# Altium schematic symbol library IC_ADI.SCHLIB: 3169 symbols (part 16 of 181)
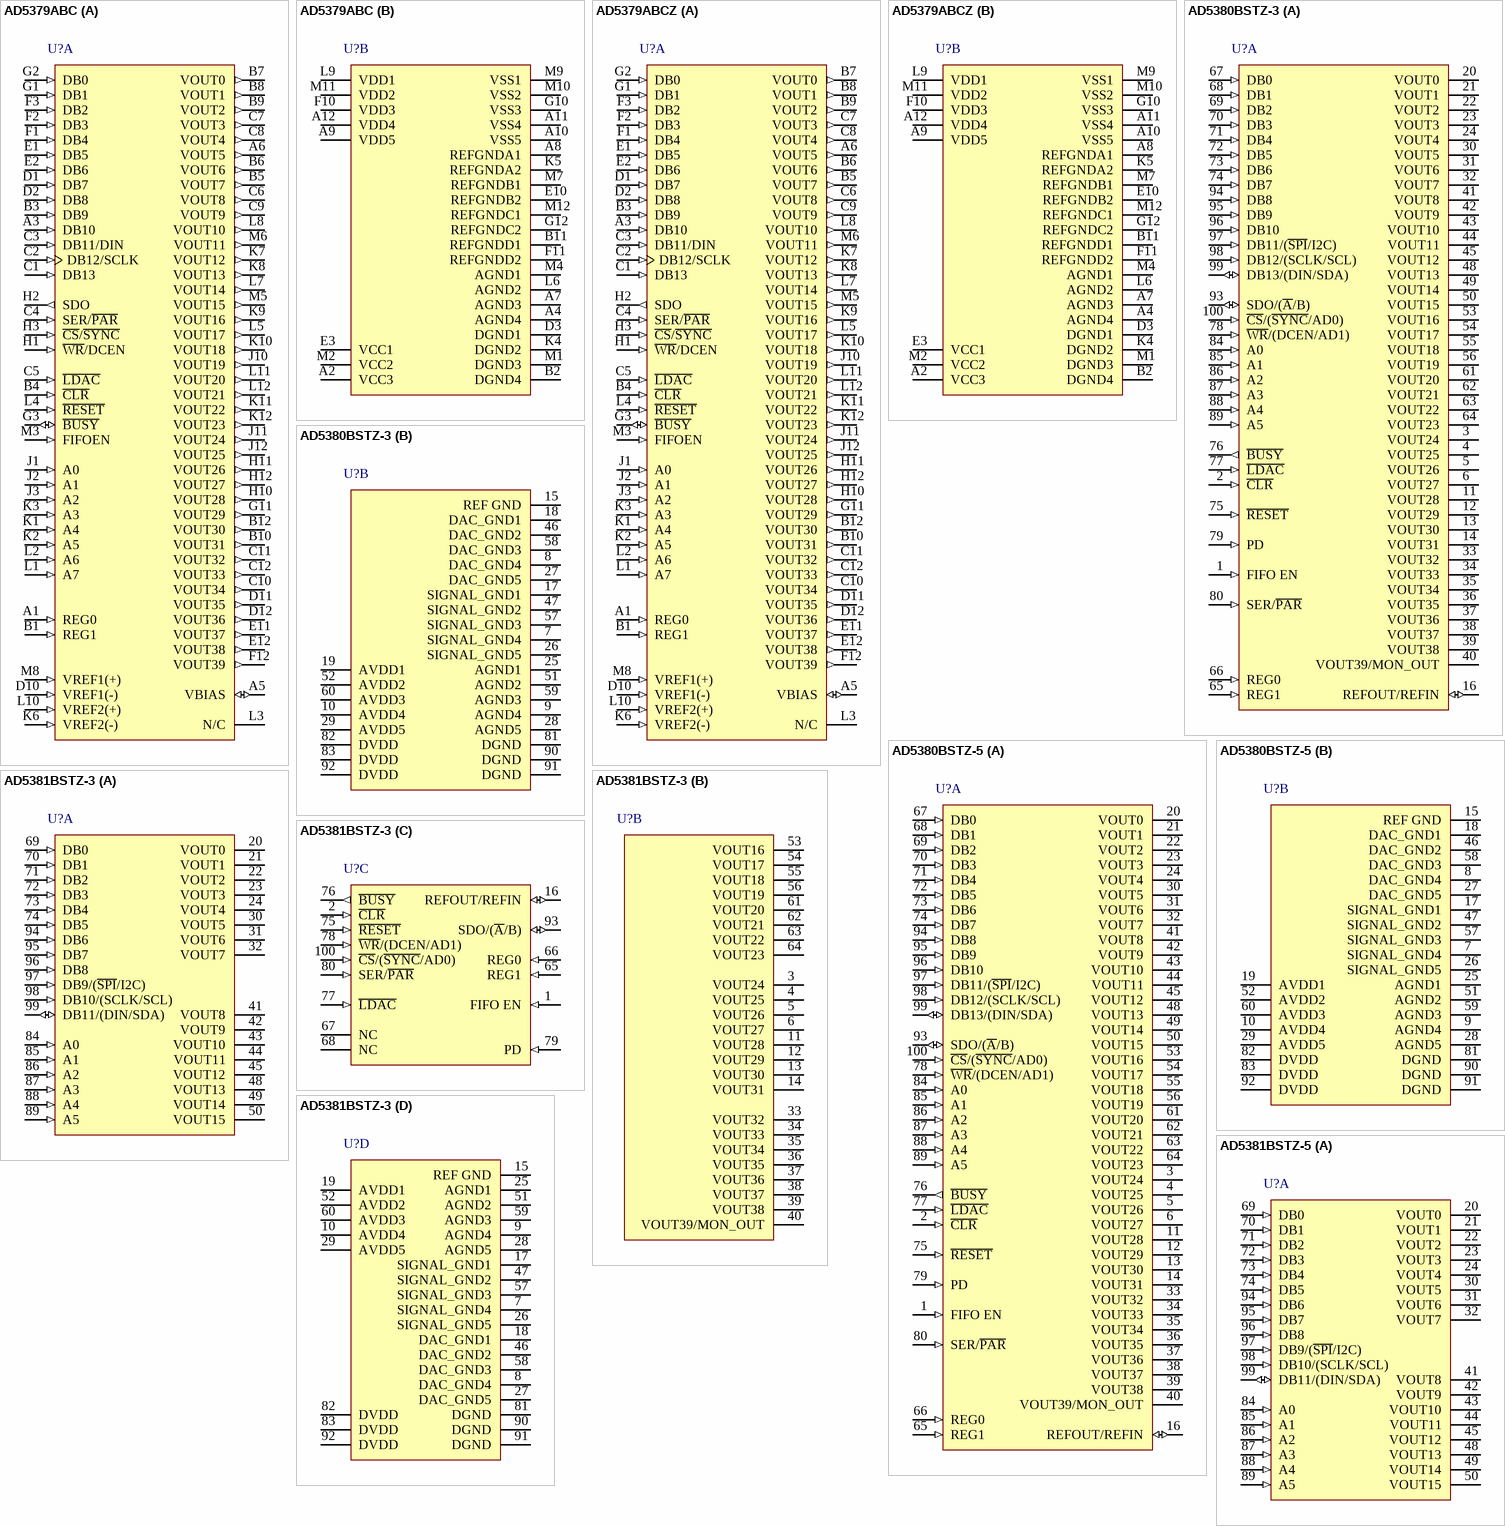
[diagram p206: symbols AD5379ABC to AD5381BSTZ-5]

## AD5379ABCZ
designator U?
40 Channel 14-Bit Bipolar Voltage Output Digital-to-Analog Converter with Parallel and Serial Interface, -40 to +85 degC, BC-108-2, Pb-Free, Tray; Generic Part Number: AD5379; PartNumber: AD5379ABCZ; # DAC Outputs: 40; Max V+: 12.6V; Resolution (Bits): 14; Settling Time: 20祍; Single Supply: No; DatasheetVersion: Rev.B; PackageVersion: 012006-0; PackageReference: BC-108-2; PackageDescription: 108-Ball Chip Scale Package Ball Grid Array [CSP_BGA]; Supplier Part Number 1: AD5379ABCZ-ND; Supplier Part Number 2: 584-AD5379ABCZ; Packing: Tray; RoHS: Y; Mounting Technology: Surface Mount; Code_JEDEC: MO-192-AAD-1; ComponentLink1Description: Manufacturer URL; ComponentLink2Description: Datasheet; ComponentLink3Description: Package Specification; ComponentLink4Description: Product URL
footprint BGA108_1.0(13X13) (Footprint not found)
part A pins: A1 REG0 (in) "Parallel Interface Register Select Input. This pin is used together with REG1 to select data registers, gain registers, offset registers, increment/decrement mode, or the soft reset function. See Table 11.", A3 DB10 (in) "Parallel Data Input. The AD5379 can accept a straight 14-bit parallel word on DB0 to DB13, where DB13 is the MSB and DB0 is the LSB.", A5 VBIAS (io) "DAC Bias Voltage Input/Output. This pin provides an access to the on-chip voltage generator voltage and is provided for bypassing and overdriving purposes only. If VREF(+) > 4.25 V, VBIAS must be pulled high externally to an (See Datasheet)", A6 VOUT5 (out) "DAC Output. Buffered analog outputs for each of the 40 DAC channels. Each analog output is capable of driving an output load of 5 kohm to ground. Typical output impedance of these amplifiers is 1 ohm.", B1 REG1 (in) "Parallel Interface Register Select Input.", B3 DB9 (in) "Parallel Data Input. The AD5379 can accept a straight 14-bit parallel word on DB0 to DB13, where DB13 is the MSB and DB0 is the LSB.", B4 ~{CLR} (in) "Asynchronous Clear Input (Level Sensitive, Active Low). When C\L\R\ is low, the input to each of the DAC output buffer stages, VOUT0 to VOUT39, is switched to the externally set potential on the relevant REFGND pin. While (See Datasheet)", B5 VOUT7 (out) "DAC Output. Buffered analog outputs for each of the 40 DAC channels. Each analog output is capable of driving an output load of 5 kohm to ground. Typical output impedance of these amplifiers is 1 ohm.", B6 VOUT6 (out) "DAC Output. Buffered analog outputs for each of the 40 DAC channels. Each analog output is capable of driving an output load of 5 kohm to ground. Typical output impedance of these amplifiers is 1 ohm.", B7 VOUT0 (out) "DAC Output. Buffered analog outputs for each of the 40 DAC channels. Each analog output is capable of driving an output load of 5 kohm to ground. Typical output impedance of these amplifiers is 1 ohm.", B8 VOUT1 (out) "DAC Output. Buffered analog outputs for each of the 40 DAC channels. Each analog output is capable of driving an output load of 5 kohm to ground. Typical output impedance of these amplifiers is 1 ohm.", B9 VOUT2 (out) "DAC Output. Buffered analog outputs for each of the 40 DAC channels. Each analog output is capable of driving an output load of 5 kohm to ground. Typical output impedance of these amplifiers is 1 ohm.", B10 VOUT31 (out) "DAC Output. Buffered analog outputs for each of the 40 DAC channels. Each analog output is capable of driving an output load of 5 kohm to ground. Typical output impedance of these amplifiers is 1 ohm.", B12 VOUT30 (out) "DAC Output. Buffered analog outputs for each of the 40 DAC channels. Each analog output is capable of driving an output load of 5 kohm to ground. Typical output impedance of these amplifiers is 1 ohm.", C1 DB13 (in) "Parallel Data Input. The AD5379 can accept a straight 14-bit parallel word on DB0 to DB13, where DB13 is the MSB and DB0 is the LSB.", C2 DB12/SCLK (in) "Parallel Data Input. The AD5379 can accept a straight 14-bit parallel word on DB0 to DB13, where DB13 is the MSB and DB0 is the LSB. Serial Clock Input. Data is clocked into the shift register on the falling edge of SCLK. (See Datasheet)", C3 DB11/DIN (in) "Parallel Data Input. The AD5379 can accept a straight 14-bit parallel word on DB0 to DB13, where DB13 is the MSB and DB0 is the LSB. Serial Data Input. Data must be valid on the falling edge of SCLK.", C4 SER/~{PAR} (in) "Interface Select Input. This pin allows the user to select whether the serial or parallel interface is used. This pin has an internal 1 Mohm pull-down resistor, meaning that the default state at power-on is parallel mode. If (See Datasheet)", C5 ~{LDAC} (in) "Load DAC Logic Input (Active Low). If \L\D\A\C\ is taken low while B\U\S\Y\ is inactive (high), the contents of the input registers are transferred to the DAC registers and the DAC outputs are updated. If L\D\A\C\ is taken (See Datasheet)", C6 VOUT8 (out) "DAC Output. Buffered analog outputs for each of the 40 DAC channels. Each analog output is capable of driving an output load of 5 kohm to ground. Typical output impedance of these amplifiers is 1 ohm.", C7 VOUT3 (out) "DAC Output. Buffered analog outputs for each of the 40 DAC channels. Each analog output is capable of driving an output load of 5 kohm to ground. Typical output impedance of these amplifiers is 1 ohm.", C8 VOUT4 (out) "DAC Output. Buffered analog outputs for each of the 40 DAC channels. Each analog output is capable of driving an output load of 5 kohm to ground. Typical output impedance of these amplifiers is 1 ohm.", C9 VOUT9 (out) "DAC Output. Buffered analog outputs for each of the 40 DAC channels. Each analog output is capable of driving an output load of 5 kohm to ground. Typical output impedance of these amplifiers is 1 ohm.", C10 VOUT34 (out) "DAC Output. Buffered analog outputs for each of the 40 DAC channels. Each analog output is capable of driving an output load of 5 kohm to ground. Typical output impedance of these amplifiers is 1 ohm.", C11 VOUT32 (out) "DAC Output. Buffered analog outputs for each of the 40 DAC channels. Each analog output is capable of driving an output load of 5 kohm to ground. Typical output impedance of these amplifiers is 1 ohm.", C12 VOUT33 (out) "DAC Output. Buffered analog outputs for each of the 40 DAC channels. Each analog output is capable of driving an output load of 5 kohm to ground. Typical output impedance of these amplifiers is 1 ohm.", D1 DB7 (in) "Parallel Data Input. The AD5379 can accept a straight 14-bit parallel word on DB0 to DB13, where DB13 is the MSB and DB0 is the LSB.", D2 DB8 (in) "Parallel Data Input. The AD5379 can accept a straight 14-bit parallel word on DB0 to DB13, where DB13 is the MSB and DB0 is the LSB.", D10 VREF1(-) (in) "Reference Input for DACs 0 to 7, 10 to 17, 20 to 27, and 30 to 37. These voltages are referred to AGND.", D11 VOUT35 (out) "DAC Output. Buffered analog outputs for each of the 40 DAC channels. Each analog output is capable of driving an output load of 5 kohm to ground. Typical output impedance of these amplifiers is 1 ohm.", D12 VOUT36 (out) "DAC Output. Buffered analog outputs for each of the 40 DAC channels. Each analog output is capable of driving an output load of 5 kohm to ground. Typical output impedance of these amplifiers is 1 ohm.", E1 DB5 (in) "Parallel Data Input. The AD5379 can accept a straight 14-bit parallel word on DB0 to DB13, where DB13 is the MSB and DB0 is the LSB.", E2 DB6 (in) "Parallel Data Input. The AD5379 can accept a straight 14-bit parallel word on DB0 to DB13, where DB13 is the MSB and DB0 is the LSB.", E11 VOUT37 (out) "DAC Output. Buffered analog outputs for each of the 40 DAC channels. Each analog output is capable of driving an output load of 5 kohm to ground. Typical output impedance of these amplifiers is 1 ohm.", E12 VOUT38 (out) "DAC Output. Buffered analog outputs for each of the 40 DAC channels. Each analog output is capable of driving an output load of 5 kohm to ground. Typical output impedance of these amplifiers is 1 ohm.", F1 DB4 (in) "Parallel Data Input. The AD5379 can accept a straight 14-bit parallel word on DB0 to DB13, where DB13 is the MSB and DB0 is the LSB.", F2 DB3 (in) "Parallel Data Input. The AD5379 can accept a straight 14-bit parallel word on DB0 to DB13, where DB13 is the MSB and DB0 is the LSB.", F3 DB2 (in) "Parallel Data Input. The AD5379 can accept a straight 14-bit parallel word on DB0 to DB13, where DB13 is the MSB and DB0 is the LSB.", F12 VOUT39 (out) "DAC Output. Buffered analog outputs for each of the 40 DAC channels. Each analog output is capable of driving an output load of 5 kohm to ground. Typical output impedance of these amplifiers is 1 ohm.", G1 DB1 (in) "Parallel Data Input. The AD5379 can accept a straight 14-bit parallel word on DB0 to DB13, where DB13 is the MSB and DB0 is the LSB.", G2 DB0 (in) "Parallel Data Input. The AD5379 can accept a straight 14-bit parallel word on DB0 to DB13, where DB13 is the MSB and DB0 is the LSB.", G3 ~{BUSY} (io) "Digital Input/Open-Drain Output. This pin must be pulled high with a pull-up resistor for correct operation. B\U\S\Y\ goes low during internal calculations of x2. During this time, the user can continue writing new data to (See Datasheet)", G11 VOUT29 (out) "DAC Output. Buffered analog outputs for each of the 40 DAC channels. Each analog output is capable of driving an output load of 5 kohm to ground. Typical output impedance of these amplifiers is 1 ohm.", H1 ~{WR}/DCEN (in) "Parallel Interface Write Input (Edge Sensitive). The rising edge of W\R\ is used in conjunction with C\S\ low and the address bus inputs to write to the selected AD5379 registers. Daisy-Chain Select Input (Level Sensitive, (See Datasheet)", H2 SDO (out) "Serial Data Output. CMOS output. SDO can be used for daisy-chaining a number of devices together. Data is clocked out on SDO on the rising edge of SCLK and is valid on the falling edge of SCLK.", H3 ~{CS}/~{SYNC} (in) "Parallel Interface Chip Select Input (Level Sensitive, Active Low). If this pin is low, the device is selected. Active Low Input. This is the frame synchronization signal for the serial interface.", H10 VOUT28 (out) "DAC Output. Buffered analog outputs for each of the 40 DAC channels. Each analog output is capable of driving an output load of 5 kohm to ground. Typical output impedance of these amplifiers is 1 ohm.", H11 VOUT26 (out) "DAC Output. Buffered analog outputs for each of the 40 DAC channels. Each analog output is capable of driving an output load of 5 kohm to ground. Typical output impedance of these amplifiers is 1 ohm.", H12 VOUT27 (out) "DAC Output. Buffered analog outputs for each of the 40 DAC channels. Each analog output is capable of driving an output load of 5 kohm to ground. Typical output impedance of these amplifiers is 1 ohm.", J1 A0 (in) "Parallel Address Input. A7 to A4 are decoded to select one group or multiple groups of registers (input registers, gain registers (m) or offset registers (c)) for a data transfer. This pin is used in conjunction with the (See Datasheet)", J2 A1 (in) "Parallel Address Input. A7 to A4 are decoded to select one group or multiple groups of registers (input registers, gain registers (m) or offset registers (c)) for a data transfer. This pin is used in conjunction with the (See Datasheet)", J3 A2 (in) "Parallel Address Input. A7 to A4 are decoded to select one group or multiple groups of registers (input registers, gain registers (m) or offset registers (c)) for a data transfer. This pin is used in conjunction with the (See Datasheet)", J10 VOUT19 (out) "DAC Output. Buffered analog outputs for each of the 40 DAC channels. Each analog output is capable of driving an output load of 5 kohm to ground. Typical output impedance of these amplifiers is 1 ohm.", J11 VOUT24 (out) "DAC Output. Buffered analog outputs for each of the 40 DAC channels. Each analog output is capable of driving an output load of 5 kohm to ground. Typical output impedance of these amplifiers is 1 ohm.", J12 VOUT25 (out) "DAC Output. Buffered analog outputs for each of the 40 DAC channels. Each analog output is capable of driving an output load of 5 kohm to ground. Typical output impedance of these amplifiers is 1 ohm.", K1 A4 (in) "Parallel Address Input. A7 to A4 are decoded to select one group or multiple groups of registers (input registers, gain registers (m) or offset registers (c)) for a data transfer. This pin is used in conjunction with the (See Datasheet)", K2 A5 (in) "Parallel Address Input. A7 to A4 are decoded to select one group or multiple groups of registers (input registers, gain registers (m) or offset registers (c)) for a data transfer. This pin is used in conjunction with the (See Datasheet)", K3 A3 (in) "Parallel Address Input. A7 to A4 are decoded to select one group or multiple groups of registers (input registers, gain registers (m) or offset registers (c)) for a data transfer. This pin is used in conjunction with the (See Datasheet)", K6 VREF2(-) (in) "Reference Input for DACs 8, 9, 18, 19, 28, 29, 38, and 39. These reference voltages are referred to AGND.", K7 VOUT12 (out) "DAC Output. Buffered analog outputs for each of the 40 DAC channels. Each analog output is capable of driving an output load of 5 kohm to ground. Typical output impedance of these amplifiers is 1 ohm.", K8 VOUT13 (out) "DAC Output. Buffered analog outputs for each of the 40 DAC channels. Each analog output is capable of driving an output load of 5 kohm to ground. Typical output impedance of these amplifiers is 1 ohm.", K9 VOUT16 (out) "DAC Output. Buffered analog outputs for each of the 40 DAC channels. Each analog output is capable of driving an output load of 5 kohm to ground. Typical output impedance of these amplifiers is 1 ohm.", K10 VOUT18 (out) "DAC Output. Buffered analog outputs for each of the 40 DAC channels. Each analog output is capable of driving an output load of 5 kohm to ground. Typical output impedance of these amplifiers is 1 ohm.", K11 VOUT22 (out) "DAC Output. Buffered analog outputs for each of the 40 DAC channels. Each analog output is capable of driving an output load of 5 kohm to ground. Typical output impedance of these amplifiers is 1 ohm.", K12 VOUT23 (out) "DAC Output. Buffered analog outputs for each of the 40 DAC channels. Each analog output is capable of driving an output load of 5 kohm to ground. Typical output impedance of these amplifiers is 1 ohm.", L1 A7 (in) "Parallel Address Input. A7 to A4 are decoded to select one group or multiple groups of registers (input registers, gain registers (m) or offset registers (c)) for a data transfer. This pin is used in conjunction with the (See Datasheet)", L2 A6 (in) "Parallel Address Input. A7 to A4 are decoded to select one group or multiple groups of registers (input registers, gain registers (m) or offset registers (c)) for a data transfer. This pin is used in conjunction with the (See Datasheet)", L3 N/C "Do not connect to this pin. Internal active pull-up device on these logic inputs. They default to a logic high condition.", L4 ~{RESET} (in) "Asynchronous Digital Reset Input (Falling Edge Sensitive). If unused, R\E\S\E\T\ may be left unconnected; an internal pull-up resistor (1 Mohm) ensures that the R\E\S\E\T\ input is held high. The function of this pin is (See Datasheet)", L5 VOUT17 (out) "DAC Output. Buffered analog outputs for each of the 40 DAC channels. Each analog output is capable of driving an output load of 5 kohm to ground. Typical output impedance of these amplifiers is 1 ohm.", L7 VOUT14 (out) "DAC Output. Buffered analog outputs for each of the 40 DAC channels. Each analog output is capable of driving an output load of 5 kohm to ground. Typical output impedance of these amplifiers is 1 ohm.", L8 VOUT10 (out) "DAC Output. Buffered analog outputs for each of the 40 DAC channels. Each analog output is capable of driving an output load of 5 kohm to ground. Typical output impedance of these amplifiers is 1 ohm.", L10 VREF2(+) (in) "Reference Input for DACs 8, 9, 18, 19, 28, 29, 38, and 39. These reference voltages are referred to AGND.", L11 VOUT20 (out) "DAC Output. Buffered analog outputs for each of the 40 DAC channels. Each analog output is capable of driving an output load of 5 kohm to ground. Typical output impedance of these amplifiers is 1 ohm.", L12 VOUT21 (out) "DAC Output. Buffered analog outputs for each of the 40 DAC channels. Each analog output is capable of driving an output load of 5 kohm to ground. Typical output impedance of these amplifiers is 1 ohm.", M3 FIFOEN (in) "FIFO Enable (Level Sensitive, Active High). When connected to DVDD, the internal FIFO is enabled, allowing the user to write to the device at full speed. FIFO is available in both serial and parallel mode. The FIFOEN pin has (See Datasheet)", M5 VOUT15 (out) "DAC Output. Buffered analog outputs for each of the 40 DAC channels. Each analog output is capable of driving an output load of 5 kohm to ground. Typical output impedance of these amplifiers is 1 ohm.", M6 VOUT11 (out) "DAC Output. Buffered analog outputs for each of the 40 DAC channels. Each analog output is capable of driving an output load of 5 kohm to ground. Typical output impedance of these amplifiers is 1 ohm.", M8 VREF1(+) (in) "Reference Input for DACs 0 to 7, 10 to 17, 20 to 27, and 30 to 37. These voltages are referred to AGND."
part B pins: A2 VCC3 (power) "Logic Power Supply; 2.7 V to 5.5 V. These pins should be decoupled with 0.1 uF ceramic capacitors and 10 uF capacitors.", A4 AGND4 (power) "Ground for All Analog Circuitry. All AGND pins should be connected to the AGND plane.", A7 AGND3 (power) "Ground for All Analog Circuitry. All AGND pins should be connected to the AGND plane.", A8 REFGNDA1 (power) "Reference Ground for DACs 0 to 7. VOUT0 to VOUT7 are referenced to this voltage.", A9 VDD5 (power) "Positive Analog Power Supply; +11.4 V to +16.5 V for Specified Performance. These pins should be decoupled with 0.1 uF ceramic capacitors and 10 uF capacitors.", A10 VSS5 (power) "Negative Analog Power Supply; -11.4 V to -16.5 V for Specified Performance. These pins should be decoupled with 0.1 uF ceramic capacitors and 10 uF capacitors.", A11 VSS4 (power) "Negative Analog Power Supply; -11.4 V to -16.5 V for Specified Performance. These pins should be decoupled with 0.1 uF ceramic capacitors and 10 uF capacitors.", A12 VDD4 (power) "Positive Analog Power Supply; +11.4 V to +16.5 V for Specified Performance. These pins should be decoupled with 0.1 uF ceramic capacitors and 10 uF capacitors.", B2 DGND4 (power) "Ground for All Digital Circuitry. All DGND pins should be connected to the DGND plane.", B11 REFGNDD1 (power) "Reference Ground for DACs 30 to 37. VOUT30 to VOUT37 are referenced to this voltage.", D3 DGND1 (power) "Ground for All Digital Circuitry. All DGND pins should be connected to the DGND plane.", E3 VCC1 (power) "Logic Power Supply; 2.7 V to 5.5 V. These pins should be decoupled with 0.1 uF ceramic capacitors and 10 uF capacitors.", E10 REFGNDB2 (power) "Reference Ground for DACs 18 and 19. VOUT18 and VOUT19 are referenced to this voltage.", F10 VDD3 (power) "Positive Analog Power Supply; +11.4 V to +16.5 V for Specified Performance. These pins should be decoupled with 0.1 uF ceramic capacitors and 10 uF capacitors.", F11 REFGNDD2 (power) "Reference Ground for DACs 38 and 39. VOUT38 and VOUT39 are referenced to this voltage.", G10 VSS3 (power) "Negative Analog Power Supply; -11.4 V to -16.5 V for Specified Performance. These pins should be decoupled with 0.1 uF ceramic capacitors and 10 uF capacitors.", G12 REFGNDC2 (power) "Reference Ground for DACs 28 and 29. VOUT28 and VOUT29 are referenced to this voltage.", K4 DGND2 (power) "Ground for All Digital Circuitry. All DGND pins should be connected to the DGND plane.", K5 REFGNDA2 (power) "Reference Ground for DACs 8 and 9. VOUT8 and VOUT9 are referenced to this voltage.", L6 AGND2 (power) "Ground for All Analog Circuitry. All AGND pins should be connected to the AGND plane.", L9 VDD1 (power) "Positive Analog Power Supply; +11.4 V to +16.5 V for Specified Performance. These pins should be decoupled with 0.1 uF ceramic capacitors and 10 uF capacitors.", M1 DGND3 (power) "Ground for All Digital Circuitry. All DGND pins should be connected to the DGND plane.", M2 VCC2 (power) "Logic Power Supply; 2.7 V to 5.5 V. These pins should be decoupled with 0.1 uF ceramic capacitors and 10 uF capacitors.", M4 AGND1 (power) "Ground for All Analog Circuitry. All AGND pins should be connected to the AGND plane.", M7 REFGNDB1 (power) "Reference Ground for DACs 10 to 17. VOUT10 to VOUT17 are referenced to this voltage.", M9 VSS1 (power) "Negative Analog Power Supply; -11.4 V to -16.5 V for Specified Performance. These pins should be decoupled with 0.1 uF ceramic capacitors and 10 uF capacitors.", M10 VSS2 (power) "Negative Analog Power Supply; -11.4 V to -16.5 V for Specified Performance. These pins should be decoupled with 0.1 uF ceramic capacitors and 10 uF capacitors.", M11 VDD2 (power) "Positive Analog Power Supply; +11.4 V to +16.5 V for Specified Performance. These pins should be decoupled with 0.1 uF ceramic capacitors and 10 uF capacitors.", M12 REFGNDC1 (power) "Reference Ground for DACs 20 to 27. VOUT20 to VOUT27 are referenced to this voltage."

## AD5380BSTZ-3
designator U?
40 Channel 14-Bit Single-Supply Voltage Output Digital-to-Analog Converter, 3 V, -40 to +85 degC, ST-100-1, Pb-Free, Tray; Generic Part Number: AD5380; PartNumber: AD5380BSTZ-3; # DAC Outputs: 40; Max V+: 5.5V; Op Pwr Diss: 125mW; Resolution (Bits): 14; Settling Time: 8祍; Single Supply: Yes; DatasheetVersion: Rev. B; PackageVersion: Jul-2007; PackageReference: ST-100-1; PackageDescription: 100-Lead Low Profile Quad Flat Package, 14 x 14 x 1.4 mm Body [LQFP]; Supplier Part Number 1: AD5380BSTZ-3-ND; Supplier Part Number 2: 584-AD5380BSTZ-3; Packing: Tray; RoHS: Y; Mounting Technology: Surface Mount; Code_JEDEC: MS-026-BED; ComponentLink1Description: Manufacturer URL; ComponentLink2Description: Datasheet; ComponentLink3Description: Package Specification; ComponentLink4Description: Product URL; ComponentLink5Description: Reference Design URL
footprint LQFP100_0.5MM (Footprint not found)
part A pins: 1 FIFO EN (in) "FIFO Enable (Level Sensitive, Active High). When connected to DVDD, the internal FIFO is enabled, allowing the user to write to the device at full speed. FIFO is only available in parallel interface mode. The status of the (See Datasheet)", 2 ~{CLR} (in) "Asynchronous Clear Input. The C\L\R\ input is falling edge sensitive. When C\L\R\ is activated, all channels are updated with the data contained in the C\L\R\ code register. B\U\S\Y\ is low for a duration of 35 us while all (See Datasheet)", 3 VOUT24 (hiz) "Buffered Analog Output for Channel 24. Each analog output is driven by a rail-to-rail output amplifier operating at a gain of 2. Each output is capable of driving an output load of 5 kohm to ground. Typical output impedance (See Datasheet)", 4 VOUT25 (hiz) "Buffered Analog Output for Channel 25. Each analog output is driven by a rail-to-rail output amplifier operating at a gain of 2. Each output is capable of driving an output load of 5 kohm to ground. Typical output impedance (See Datasheet)", 5 VOUT26 (hiz) "Buffered Analog Output for Channel 26. Each analog output is driven by a rail-to-rail output amplifier operating at a gain of 2. Each output is capable of driving an output load of 5 kohm to ground. Typical output impedance (See Datasheet)", 6 VOUT27 (hiz) "Buffered Analog Output for Channel 27. Each analog output is driven by a rail-to-rail output amplifier operating at a gain of 2. Each output is capable of driving an output load of 5 kohm to ground. Typical output impedance (See Datasheet)", 11 VOUT28 (hiz) "Buffered Analog Output for Channel 28. Each analog output is driven by a rail-to-rail output amplifier operating at a gain of 2. Each output is capable of driving an output load of 5 kohm to ground. Typical output impedance (See Datasheet)", 12 VOUT29 (hiz) "Buffered Analog Output for Channel 29. Each analog output is driven by a rail-to-rail output amplifier operating at a gain of 2. Each output is capable of driving an output load of 5 kohm to ground. Typical output impedance (See Datasheet)", 13 VOUT30 (hiz) "Buffered Analog Output for Channel 30. Each analog output is driven by a rail-to-rail output amplifier operating at a gain of 2. Each output is capable of driving an output load of 5 kohm to ground. Typical output impedance (See Datasheet)", 14 VOUT31 (hiz) "Buffered Analog Output for Channel 31. Each analog output is driven by a rail-to-rail output amplifier operating at a gain of 2. Each output is capable of driving an output load of 5 kohm to ground. Typical output impedance (See Datasheet)", 16 REFOUT/REFIN (io) "The AD5381 Contains a Common REFOUT/REFIN Pin. When the internal reference is selected, this pin is the reference output. If the application requires an external reference, it can be applied to this pin and the internal (See Datasheet)", 20 VOUT0 (hiz) "Buffered Analog Output for Channel 0. Each analog output is driven by a rail-to-rail output amplifier operating at a gain of 2. Each output is capable of driving an output load of 5 kohm to ground. Typical output impedance (See Datasheet)", 21 VOUT1 (hiz) "Buffered Analog Output for Channel 1. Each analog output is driven by a rail-to-rail output amplifier operating at a gain of 2. Each output is capable of driving an output load of 5 kohm to ground. Typical output impedance (See Datasheet)", 22 VOUT2 (hiz) "Buffered Analog Output for Channel 2. Each analog output is driven by a rail-to-rail output amplifier operating at a gain of 2. Each output is capable of driving an output load of 5 kohm to ground. Typical output impedance (See Datasheet)", 23 VOUT3 (hiz) "Buffered Analog Output for Channel 3. Each analog output is driven by a rail-to-rail output amplifier operating at a gain of 2. Each output is capable of driving an output load of 5 kohm to ground. Typical output impedance (See Datasheet)", 24 VOUT4 (hiz) "Buffered Analog Output for Channel 4. Each analog output is driven by a rail-to-rail output amplifier operating at a gain of 2. Each output is capable of driving an output load of 5 kohm to ground. Typical output impedance (See Datasheet)", 30 VOUT5 (hiz) "Buffered Analog Output for Channel 5. Each analog output is driven by a rail-to-rail output amplifier operating at a gain of 2. Each output is capable of driving an output load of 5 kohm to ground. Typical output impedance (See Datasheet)", 31 VOUT6 (hiz) "Buffered Analog Output for Channel 6. Each analog output is driven by a rail-to-rail output amplifier operating at a gain of 2. Each output is capable of driving an output load of 5 kohm to ground. Typical output impedance (See Datasheet)", 32 VOUT7 (hiz) "Buffered Analog Output for Channel 7. Each analog output is driven by a rail-to-rail output amplifier operating at a gain of 2. Each output is capable of driving an output load of 5 kohm to ground. Typical output impedance (See Datasheet)", 33 VOUT32 (hiz) "Buffered Analog Output for Channel 32. Each analog output is driven by a rail-to-rail output amplifier operating at a gain of 2. Each output is capable of driving an output load of 5 kohm to ground. Typical output impedance (See Datasheet)", 34 VOUT33 (hiz) "Buffered Analog Output for Channel 33. Each analog output is driven by a rail-to-rail output amplifier operating at a gain of 2. Each output is capable of driving an output load of 5 kohm to ground. Typical output impedance (See Datasheet)", 35 VOUT34 (hiz) "Buffered Analog Output for Channel 34. Each analog output is driven by a rail-to-rail output amplifier operating at a gain of 2. Each output is capable of driving an output load of 5 kohm to ground. Typical output impedance (See Datasheet)", 36 VOUT35 (hiz) "Buffered Analog Output for Channel 35. Each analog output is driven by a rail-to-rail output amplifier operating at a gain of 2. Each output is capable of driving an output load of 5 kohm to ground. Typical output impedance (See Datasheet)", 37 VOUT36 (hiz) "Buffered Analog Output for Channel 36. Each analog output is driven by a rail-to-rail output amplifier operating at a gain of 2. Each output is capable of driving an output load of 5 kohm to ground. Typical output impedance (See Datasheet)", 38 VOUT37 (hiz) "Buffered Analog Output for Channel 37. Each analog output is driven by a rail-to-rail output amplifier operating at a gain of 2. Each output is capable of driving an output load of 5 kohm to ground. Typical output impedance (See Datasheet)", 39 VOUT38 (hiz) "Buffered Analog Output for Channel 38. Each analog output is driven by a rail-to-rail output amplifier operating at a gain of 2. Each output is capable of driving an output load of 5 kohm to ground. Typical output impedance (See Datasheet)", 40 VOUT39/MON_OUT (hiz) "This pin has a dual function. It acts as a buffered output for Channel 39 in default mode. However, when the monitor function is enabled, this pin acts as the output of a 39-to-1 channel multiplexer that can be programmed to (See Datasheet)", 41 VOUT8 (hiz) "Buffered Analog Output for Channel 8. Each analog output is driven by a rail-to-rail output amplifier operating at a gain of 2. Each output is capable of driving an output load of 5 kohm to ground. Typical output impedance (See Datasheet)", 42 VOUT9 (hiz) "Buffered Analog Output for Channel 9. Each analog output is driven by a rail-to-rail output amplifier operating at a gain of 2. Each output is capable of driving an output load of 5 kohm to ground. Typical output impedance (See Datasheet)", 43 VOUT10 (hiz) "Buffered Analog Output for Channel 10. Each analog output is driven by a rail-to-rail output amplifier operating at a gain of 2. Each output is capable of driving an output load of 5 kohm to ground. Typical output impedance (See Datasheet)", 44 VOUT11 (hiz) "Buffered Analog Output for Channel 11. Each analog output is driven by a rail-to-rail output amplifier operating at a gain of 2. Each output is capable of driving an output load of 5 kohm to ground. Typical output impedance (See Datasheet)", 45 VOUT12 (hiz) "Buffered Analog Output for Channel 12. Each analog output is driven by a rail-to-rail output amplifier operating at a gain of 2. Each output is capable of driving an output load of 5 kohm to ground. Typical output impedance (See Datasheet)", 48 VOUT13 (hiz) "Buffered Analog Output for Channel 13. Each analog output is driven by a rail-to-rail output amplifier operating at a gain of 2. Each output is capable of driving an output load of 5 kohm to ground. Typical output impedance (See Datasheet)", 49 VOUT14 (hiz) "Buffered Analog Output for Channel 14. Each analog output is driven by a rail-to-rail output amplifier operating at a gain of 2. Each output is capable of driving an output load of 5 kohm to ground. Typical output impedance (See Datasheet)", 50 VOUT15 (hiz) "Buffered Analog Output for Channel 15. Each analog output is driven by a rail-to-rail output amplifier operating at a gain of 2. Each output is capable of driving an output load of 5 kohm to ground. Typical output impedance (See Datasheet)", 53 VOUT16 (hiz) "Buffered Analog Output for Channel 16. Each analog output is driven by a rail-to-rail output amplifier operating at a gain of 2. Each output is capable of driving an output load of 5 kohm to ground. Typical output impedance (See Datasheet)", 54 VOUT17 (hiz) "Buffered Analog Output for Channel 17. Each analog output is driven by a rail-to-rail output amplifier operating at a gain of 2. Each output is capable of driving an output load of 5 kohm to ground. Typical output impedance (See Datasheet)", 55 VOUT18 (hiz) "Buffered Analog Output for Channel 18. Each analog output is driven by a rail-to-rail output amplifier operating at a gain of 2. Each output is capable of driving an output load of 5 kohm to ground. Typical output impedance (See Datasheet)", 56 VOUT19 (hiz) "Buffered Analog Output for Channel 19. Each analog output is driven by a rail-to-rail output amplifier operating at a gain of 2. Each output is capable of driving an output load of 5 kohm to ground. Typical output impedance (See Datasheet)", 61 VOUT20 (hiz) "Buffered Analog Output for Channel 20. Each analog output is driven by a rail-to-rail output amplifier operating at a gain of 2. Each output is capable of driving an output load of 5 kohm to ground. Typical output impedance (See Datasheet)", 62 VOUT21 (hiz) "Buffered Analog Output for Channel 21. Each analog output is driven by a rail-to-rail output amplifier operating at a gain of 2. Each output is capable of driving an output load of 5 kohm to ground. Typical output impedance (See Datasheet)", 63 VOUT22 (hiz) "Buffered Analog Output for Channel 22. Each analog output is driven by a rail-to-rail output amplifier operating at a gain of 2. Each output is capable of driving an output load of 5 kohm to ground. Typical output impedance (See Datasheet)", 64 VOUT23 (hiz) "Buffered Analog Output for Channel 23. Each analog output is driven by a rail-to-rail output amplifier operating at a gain of 2. Each output is capable of driving an output load of 5 kohm to ground. Typical output impedance (See Datasheet)", 65 REG1 (in) "In parallel interface mode, REG1 and REG0 are used in decoding the destination registers for the input data. REG1 and REG0 are decoded to address the input data register, offset register, or gain register for the selected (See Datasheet)", 66 REG0 (in) "In parallel interface mode, REG1 and REG0 are used in decoding the destination registers for the input data. REG1 and REG0 are decoded to address the input data register, offset register, or gain register for the selected (See Datasheet)", 67 DB0 (in) "Parallel Data Bus.DB0 is the LSB of the input data-word on the AD5380.", 68 DB1 (in) "Parallel Data Bus.", 69 DB2 (in) "Parallel Data Bus.", 70 DB3 (in) "Parallel Data Bus.", 71 DB4 (in) "Parallel Data Bus.", 72 DB5 (in) "Parallel Data Bus.", 73 DB6 (in) "Parallel Data Bus.", 74 DB7 (in) "Parallel Data Bus.", 75 ~{RESET} (in) "Asynchronous Digital Reset Input (Falling Edge Sensitive). The function of this pin is equivalent to that of the power-on reset generator. When this pin is taken low, the state machine initiates a reset sequence to digitally (See Datasheet)", 76 ~{BUSY} (out) "Digital CMOS Output. B\U\S\Y\ goes low during internal calculations of the data (x2) loaded to the DAC data register. During this time, the user can continue writing new data to the x1, c, and m registers in parallel mode (See Datasheet)", 77 ~{LDAC} (in) "Load DAC Logic Input (Active Low). If L\D\A\C\ is taken low while B\U\S\Y\ is inactive (high), the contents of the input registers are transferred to the DAC registers and the DAC outputs are updated. If L\D\A\C\ is taken (See Datasheet)", 78 ~{WR}/(DCEN/AD1) (in) "Multifunction Pin. In parallel interface mode, this pin acts as write enable. In serial interface mode, this pin acts as a daisy-chain enable in SPI mode, and as a hardware address pin in I2C mode. Parallel Interface Write (See Datasheet)", 79 PD (in) "Power Down (Level Sensitive, Active High). PD is used to place the device in low power mode where the device consumes 2 uA analog supply current and 20 uA digital supply current. In power-down mode, all internal analog (See Datasheet)", 80 SER/~{PAR} (in) "Interface Select Input. This pin allows the user to select whether the serial or parallel interface is used. If it is tied high, the serial interface mode is selected and Pin 97 (S\P\I\/I2C) is used to determine if the (See Datasheet)", 84 A0 (in) "Parallel Address Input. A5 to A0 are decoded to address one of the AD5380抯 40 input channels. Used in conjunction with the REG1 and REG0 pins to determine the destination register for the input data.", 85 A1 (in) "Parallel Address Input. A5 to A0 are decoded to address one of the AD5380抯 40 input channels. Used in conjunction with the REG1 and REG0 pins to determine the destination register for the input data.", 86 A2 (in) "Parallel Address Input. A5 to A0 are decoded to address one of the AD5380抯 40 input channels. Used in conjunction with the REG1 and REG0 pins to determine the destination register for the input data.", 87 A3 (in) "Parallel Address Input. A5 to A0 are decoded to address one of the AD5380抯 40 input channels. Used in conjunction with the REG1 and REG0 pins to determine the destination register for the input data.", 88 A4 (in) "Parallel Address Input. A5 to A0 are decoded to address one of the AD5380抯 40 input channels. Used in conjunction with the REG1 and REG0 pins to determine the destination register for the input data.", 89 A5 (in) "Parallel Address Input. A5 to A0 are decoded to address one of the AD5380抯 40 input channels. Used in conjunction with the REG1 and REG0 pins to determine the destination register for the input data.", 93 SDO/(~{A}/B) (io) "Serial Data Output in Serial Interface Mode. Three-stateable CMOS output. SDO can be used for daisy-chaining a number of devices together. Data is clocked out on SDO on the rising edge of SCLK, and is valid on the falling (See Datasheet)", 94 DB8 (in) "Parallel Data Bus.", 95 DB9 (in) "Parallel Data Bus.", 96 DB10 (in) "Parallel Data Bus.", 97 DB11/(~{SPI}/I2C) (in) "Multifunction Input Pin. In parallel interface mode, this pin acts as DB11 of the parallel input data-word. In serial interface mode, this pin acts as serial interface mode select. When serial interface mode is selected (See Datasheet)", 98 DB12/(SCLK/SCL) (in) "Multifunction Input Pin. In parallel interface mode, this pin acts as DB12 of the parallel input data-word. In serial interface mode, this pin acts as a serial clock input. Serial Interface Mode. In serial interface mode, (See Datasheet)", 99 DB13/(DIN/SDA) (io) "Multifunction Data Input Pin. In parallel interface mode, this pin acts as DB13 of the parallel input data-word. Serial Interface Mode. In serial interface mode, this pin acts as the serial data input. Data must be valid on (See Datasheet)", 100 ~{CS}/(~{SYNC}/AD0) (in) "In parallel interface mode, this pin acts as chip select input (level sensitive, active low). When low, the AD5381 is selected. Serial Interface Mode. This is the frame synchronization input signal for the serial clock and (See Datasheet)"
part B pins: 7 SIGNAL_GND4 (power) "Analog Ground Reference Points for Each Group of Eight Output Channels. All SIGNAL_GND pins are tied together internally and should be connected to the AGND plane as close as possible to the AD5380.", 8 DAC_GND4 (power) "Each group of eight channels contains a DAC_GND pin. This is the ground reference point for the internal 12-bit DAC. These pins shound be connected to the AGND plane.", 9 AGND4 (power) "Analog Ground Reference Point. Each group of eight channels contains an AGND pin. All AGND pins should be connected externally to the AGND plane.", 10 AVDD4 (power) "Analog Supply Pin. Each group of eight channels has a separate AVDD pin. These pins are shorted internally and should be decoupled with a 0.1 uF ceramic capacitor and 10 uF tantalum capacitor. Operating range for the (See Datasheet)", 15 REF GND (power) "Ground Reference Point for the Internal Reference.", 17 SIGNAL_GND1 (power) "Analog Ground Reference Points for Each Group of Eight Output Channels. All SIGNAL_GND pins are tied together internally and should be connected to the AGND plane as close as possible to the AD5380.", 18 DAC_GND1 (power) "Each group of eight channels contains a DAC_GND pin. This is the ground reference point for the internal 12-bit DAC. These pins shound be connected to the AGND plane.", 19 AVDD1 (power) "Analog Supply Pin. Each group of eight channels has a separate AVDD pin. These pins are shorted internally and should be decoupled with a 0.1 uF ceramic capacitor and 10 uF tantalum capacitor. Operating range for the (See Datasheet)", 25 AGND1 (power) "Analog Ground Reference Point. Each group of eight channels contains an AGND pin. All AGND pins should be connected externally to the AGND plane.", 26 SIGNAL_GND5 (power) "Analog Ground Reference Points for Each Group of Eight Output Channels. All SIGNAL_GND pins are tied together internally and should be connected to the AGND plane as close as possible to the AD5380.", 27 DAC_GND5 (power) "Each group of eight channels contains a DAC_GND pin. This is the ground reference point for the internal 12-bit DAC. These pins shound be connected to the AGND plane.", 28 AGND5 (power) "Analog Ground Reference Point. Each group of eight channels contains an AGND pin. All AGND pins should be connected externally to the AGND plane.", 29 AVDD5 (power) "Analog Supply Pin. Each group of eight channels has a separate AVDD pin. These pins are shorted internally and should be decoupled with a 0.1 uF ceramic capacitor and 10 uF tantalum capacitor. Operating range for the (See Datasheet)", 46 DAC_GND2 (power) "Each group of eight channels contains a DAC_GND pin. This is the ground reference point for the internal 12-bit DAC. These pins shound be connected to the AGND plane.", 47 SIGNAL_GND2 (power) "Analog Ground Reference Points for Each Group of Eight Output Channels. All SIGNAL_GND pins are tied together internally and should be connected to the AGND plane as close as possible to the AD5380.", 51 AGND2 (power) "Analog Ground Reference Point. Each group of eight channels contains an AGND pin. All AGND pins should be connected externally to the AGND plane.", 52 AVDD2 (power) "Analog Supply Pin. Each group of eight channels has a separate AVDD pin. These pins are shorted internally and should be decoupled with a 0.1 uF ceramic capacitor and 10 uF tantalum capacitor. Operating range for the (See Datasheet)", 57 SIGNAL_GND3 (power) "Analog Ground Reference Points for Each Group of Eight Output Channels. All SIGNAL_GND pins are tied together internally and should be connected to the AGND plane as close as possible to the AD5380.", 58 DAC_GND3 (power) "Each group of eight channels contains a DAC_GND pin. This is the ground reference point for the internal 12-bit DAC. These pins shound be connected to the AGND plane.", 59 AGND3 (power) "Analog Ground Reference Point. Each group of eight channels contains an AGND pin. All AGND pins should be connected externally to the AGND plane.", 60 AVDD3 (power) "Analog Supply Pin. Each group of eight channels has a separate AVDD pin. These pins are shorted internally and should be decoupled with a 0.1 uF ceramic capacitor and 10 uF tantalum capacitor. Operating range for the (See Datasheet)", 81 DGND (power) "Ground for All Digital Circuitry.", 82 DVDD (power) "Logic Power Supply. Guaranteed operating range is 2.7 V to 5.5 V. It is recommended that these pins be decoupled with 0.1 uF ceramic and 10 uF tantalum capacitors to DGND.", 83 DVDD (power) "Logic Power Supply. Guaranteed operating range is 2.7 V to 5.5 V. It is recommended that these pins be decoupled with 0.1 uF ceramic and 10 uF tantalum capacitors to DGND.", 90 DGND (power) "Ground for All Digital Circuitry.", 91 DGND (power) "Ground for All Digital Circuitry.", 92 DVDD (power) "Logic Power Supply. Guaranteed operating range is 2.7 V to 5.5 V. It is recommended that these pins be decoupled with 0.1 uF ceramic and 10 uF tantalum capacitors to DGND."